# Altium footprint library CPU_STM.PcbLib: 216 footprints (part 15 of 15)
Each footprint in its own frame and in the unit in brackets; x right, y up, seen from the top. Pads: shape width x height; smd on the part's side, far side on the other; paste and mask are expansions set on the pad; w line width, h text height; cw(c..) or ccw(c..) is an arc to the next point about the centre after c.
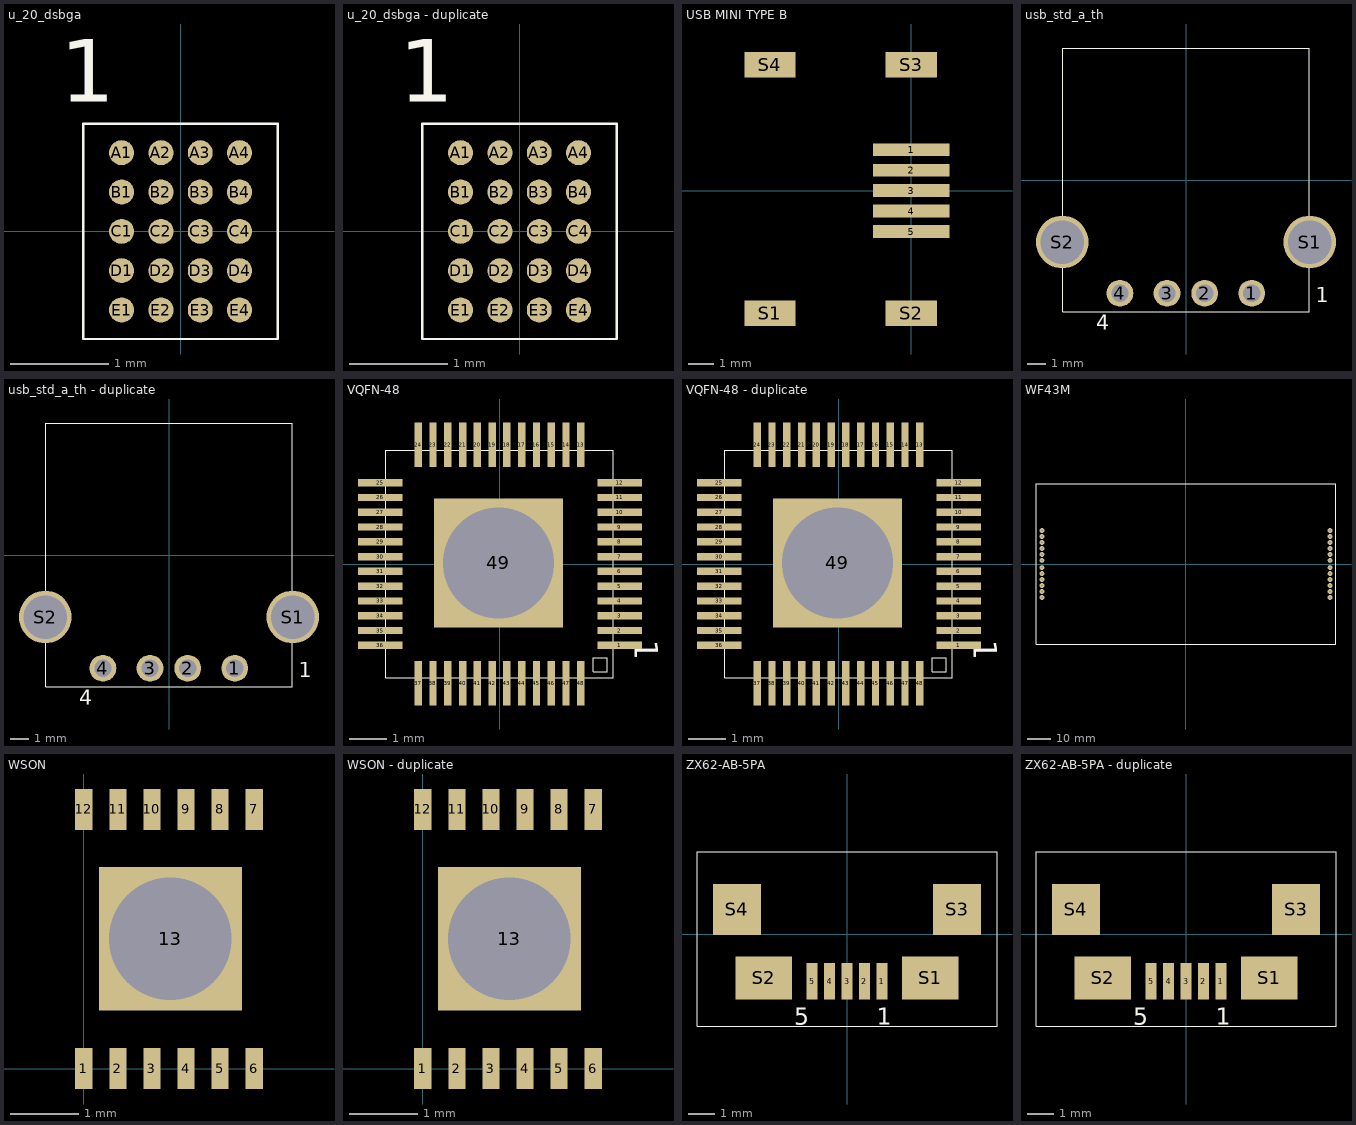
[diagram p14: the footprints below, top view; thin cyan lines are the x and y axes]

## u_20_dsbga [mil] "U_20_DSBGA"
pads (20):
  round 10 smd mask+1.57: A1(-23.62,31.5) A2(-7.87,31.5) A3(7.87,31.5) A4(23.62,31.5) B1(-23.62,15.75) B2(-7.87,15.75) B3(7.87,15.75) B4(23.62,15.75) C1(-23.62,0) C2(-7.87,0) C3(7.87,0) C4(23.62,0) D1(-23.62,-15.75) D2(-7.87,-15.75) D3(7.87,-15.75) D4(23.62,-15.75) E1(-23.62,-31.5) E2(-7.87,-31.5) E3(7.87,-31.5) E4(23.62,-31.5)
Top Overlay:
  lines w1: -38.98,-43.11 38.98,-43.11 38.98,43.11 -38.98,43.11 -38.98,-43.11
  text "1" at -48.28,51.83 h25.2

## u_20_dsbga - duplicate [mil] "U_20_DSBGA"
pads (20):
  round 10 smd mask+1.57: A1(-23.62,31.5) A2(-7.87,31.5) A3(7.87,31.5) A4(23.62,31.5) B1(-23.62,15.75) B2(-7.87,15.75) B3(7.87,15.75) B4(23.62,15.75) C1(-23.62,0) C2(-7.87,0) C3(7.87,0) C4(23.62,0) D1(-23.62,-15.75) D2(-7.87,-15.75) D3(7.87,-15.75) D4(23.62,-15.75) E1(-23.62,-31.5) E2(-7.87,-31.5) E3(7.87,-31.5) E4(23.62,-31.5)
Top Overlay:
  lines w1: -38.98,-43.11 38.98,-43.11 38.98,43.11 -38.98,43.11 -38.98,-43.11
  text "1" at -48.28,51.83 h25.2

## USB MINI TYPE B [mm] "USB MINI TYPE B"
pads (9):
  rect 3x0.5 smd mask+0.06: 1(0,1.6) 2(0,0.8) 3(0,0) 4(0,-0.8) 5(0,-1.6)
  rect 2x1 smd mask+0.06: S1(-5.52,-4.798) S2(0,-4.798) S3(0,4.925) S4(-5.52,4.925)
3D body "usb_a-usb_b-m5-smd-c.stp": height 3.93, standoff -1, extent -8.508,-4.8 0.742,5.1

## usb_std_a_th [mil] "USB_STD_A_TH"
pads (6):
  round 56 hole 36: 1(137.5,-236.5) 2(39.08,-236.5) 3(-39.66,-236.5) 4(-138.09,-236.5)
  round 110 hole 91: S1(258.5,-129.5) S2(-258.5,-129.5)
Top Overlay:
  lines w1: -258,-275.5 -258,275.5 258,275.5 258,-275.5 -258,-275.5
  text "4" at -187.64,-312.71 h31.1
  text "1" at 270.78,-255.34 h31.1

## usb_std_a_th - duplicate [mil] "USB_STD_A_TH"
pads (6):
  round 56 hole 36: 1(137.5,-236.5) 2(39.08,-236.5) 3(-39.66,-236.5) 4(-138.09,-236.5)
  round 110 hole 91: S1(258.5,-129.5) S2(-258.5,-129.5)
Top Overlay:
  lines w1: -258,-275.5 -258,275.5 258,275.5 258,-275.5 -258,-275.5
  text "4" at -187.64,-312.71 h31.1
  text "1" at 270.78,-255.34 h31.1

## VQFN-48 [mm] "U_48_RSL"
pads (49):
  rect 1.2x0.2 smd mask+0.051: 1(3.255,-2.2) 2(3.255,-1.8) 3(3.255,-1.4) 4(3.255,-1) 5(3.255,-0.6) 6(3.255,-0.2) 7(3.255,0.2) 8(3.255,0.6) 9(3.255,1) 10(3.255,1.4) 11(3.255,1.8) 12(3.255,2.2) 25(-3.229,2.2) 26(-3.229,1.8) 27(-3.229,1.4) 28(-3.229,1) 29(-3.229,0.6) 30(-3.229,0.2) 31(-3.229,-0.2) 32(-3.229,-0.6) 33(-3.229,-1) 34(-3.229,-1.4) 35(-3.229,-1.8) 36(-3.229,-2.2)
  rect 0.2x1.2 smd mask+0.051: 13(2.2,3.229) 14(1.8,3.229) 15(1.4,3.229) 16(1,3.229) 17(0.6,3.229) 18(0.2,3.229) 19(-0.2,3.229) 20(-0.6,3.229) 21(-1,3.229) 22(-1.4,3.229) 23(-1.8,3.229) 24(-2.2,3.229) 37(-2.2,-3.229) 38(-1.8,-3.229) 39(-1.4,-3.229) 40(-1,-3.229) 41(-0.6,-3.229) 42(-0.2,-3.229) 43(0.2,-3.229) 44(0.6,-3.229) 45(1,-3.229) 46(1.4,-3.229) 47(1.8,-3.229) 48(2.2,-3.229)
  rect 3.5x3.5 hole 3 square: 49(-0.029,0.029)
Top Overlay:
  lines w0.025: -3.075,-3.075 3.075,-3.075 3.075,3.075 -3.075,3.075 -3.075,-3.075 ; 2.54,-2.921 2.921,-2.921 2.921,-2.54 2.54,-2.54 2.54,-2.921
  text "1" at 3.653,-2.044 h0.64
Top Paste:
  lines w0.025: -1.8,-2.25 -0.65,-2.25 -0.65,-1.1 -1.8,-1.1 -1.8,-2.25 ; -1.8,-0.8 -0.65,-0.8 -0.65,0.35 -1.8,0.35 -1.8,-0.8 ; -1.8,0.65 -0.65,0.65 -0.65,1.8 -1.8,1.8 -1.8,0.65 ; -0.35,-2.25 0.8,-2.25 0.8,-1.1 -0.35,-1.1 -0.35,-2.25 ; -0.35,-0.8 0.8,-0.8 0.8,0.35 -0.35,0.35 -0.35,-0.8 ; -0.35,0.65 0.8,0.65 0.8,1.8 -0.35,1.8 -0.35,0.65 ; 1.1,-2.25 2.25,-2.25 2.25,-1.1 1.1,-1.1 1.1,-2.25 ; 1.1,-0.8 2.25,-0.8 2.25,0.35 1.1,0.35 1.1,-0.8 ; 1.1,0.65 2.25,0.65 2.25,1.8 1.1,1.8 1.1,0.65

## VQFN-48 - duplicate [mm] "U_48_RSL"
pads (49):
  rect 1.2x0.2 smd mask+0.051: 1(3.255,-2.2) 2(3.255,-1.8) 3(3.255,-1.4) 4(3.255,-1) 5(3.255,-0.6) 6(3.255,-0.2) 7(3.255,0.2) 8(3.255,0.6) 9(3.255,1) 10(3.255,1.4) 11(3.255,1.8) 12(3.255,2.2) 25(-3.229,2.2) 26(-3.229,1.8) 27(-3.229,1.4) 28(-3.229,1) 29(-3.229,0.6) 30(-3.229,0.2) 31(-3.229,-0.2) 32(-3.229,-0.6) 33(-3.229,-1) 34(-3.229,-1.4) 35(-3.229,-1.8) 36(-3.229,-2.2)
  rect 0.2x1.2 smd mask+0.051: 13(2.2,3.229) 14(1.8,3.229) 15(1.4,3.229) 16(1,3.229) 17(0.6,3.229) 18(0.2,3.229) 19(-0.2,3.229) 20(-0.6,3.229) 21(-1,3.229) 22(-1.4,3.229) 23(-1.8,3.229) 24(-2.2,3.229) 37(-2.2,-3.229) 38(-1.8,-3.229) 39(-1.4,-3.229) 40(-1,-3.229) 41(-0.6,-3.229) 42(-0.2,-3.229) 43(0.2,-3.229) 44(0.6,-3.229) 45(1,-3.229) 46(1.4,-3.229) 47(1.8,-3.229) 48(2.2,-3.229)
  rect 3.5x3.5 hole 3 square: 49(-0.029,0.029)
Top Overlay:
  lines w0.025: -3.075,-3.075 3.075,-3.075 3.075,3.075 -3.075,3.075 -3.075,-3.075 ; 2.54,-2.921 2.921,-2.921 2.921,-2.54 2.54,-2.54 2.54,-2.921
  text "1" at 3.653,-2.044 h0.64
Top Paste:
  lines w0.025: -1.8,-2.25 -0.65,-2.25 -0.65,-1.1 -1.8,-1.1 -1.8,-2.25 ; -1.8,-0.8 -0.65,-0.8 -0.65,0.35 -1.8,0.35 -1.8,-0.8 ; -1.8,0.65 -0.65,0.65 -0.65,1.8 -1.8,1.8 -1.8,0.65 ; -0.35,-2.25 0.8,-2.25 0.8,-1.1 -0.35,-1.1 -0.35,-2.25 ; -0.35,-0.8 0.8,-0.8 0.8,0.35 -0.35,0.35 -0.35,-0.8 ; -0.35,0.65 0.8,0.65 0.8,1.8 -0.35,1.8 -0.35,0.65 ; 1.1,-2.25 2.25,-2.25 2.25,-1.1 1.1,-1.1 1.1,-2.25 ; 1.1,-0.8 2.25,-0.8 2.25,0.35 1.1,0.35 1.1,-0.8 ; 1.1,0.65 2.25,0.65 2.25,1.8 1.1,1.8 1.1,0.65

## WF43M [mm]
pads (24):
  round 2 hole 0.762: 1(-60.25,-14) 2(-60.25,-11.5) 3(-60.25,-9) 4(-60.25,-6.5) 5(-60.25,-4) 6(-60.25,-1.5) 7(-60.25,1.5) 8(-60.25,4) 9(-60.25,6.5) 10(-60.25,9) 11(-60.25,14) 12(-60.25,11.5) 13(60.25,-14) 14(60.25,-11.5) 15(60.25,-9) 16(60.25,-6.5) 17(60.25,-4) 18(60.25,-1.5) 19(60.25,1.5) 20(60.25,4) 21(60.25,6.5) 22(60.25,9) 23(60.25,11.5) 24(60.25,14)
Top Overlay:
  lines w0.2: -27.75,-33.6 -36.5,-33.6 -54,-33.6 -62.75,-33.6 ; -62.75,-33.6 -62.75,33.6 62.75,33.6 62.75,-33.6 -62.75,-33.6

## WSON [mm] "U_48_RSL"
pads (13):
  rect 0.25x0.6 smd mask+0.2: 1(0,0) 2(0.5,0) 3(1,0) 4(1.5,0) 5(2,0) 6(2.5,0) 7(2.5,3.8) 8(2,3.8) 9(1.5,3.8) 10(1,3.8) 11(0.5,3.8) 12(0,3.8)
  rect 2.1x2.1 hole 1.8 square mask+0.2: 13(1.27,1.905)

## WSON - duplicate [mm] "U_48_RSL"
pads (13):
  rect 0.25x0.6 smd mask+0.2: 1(0,0) 2(0.5,0) 3(1,0) 4(1.5,0) 5(2,0) 6(2.5,0) 7(2.5,3.8) 8(2,3.8) 9(1.5,3.8) 10(1,3.8) 11(0.5,3.8) 12(0,3.8)
  rect 2.1x2.1 hole 1.8 square mask+0.2: 13(1.27,1.905)

## ZX62-AB-5PA [mm] "ZX62-AB-5PA"
pads (9):
  rect 0.4x1.35 smd: 1(1.3,-1.75) 2(0.65,-1.75) 3(0,-1.75) 4(-0.65,-1.75) 5(-1.3,-1.75)
  rect 2.1x1.6 smd: S1(3.1,-1.625) S2(-3.1,-1.625)
  rect 1.8x1.9 smd: S3(4.1,0.925) S4(-4.1,0.925)
Top Overlay:
  lines w0.025: -5.588,-3.429 -5.588,3.075 5.588,3.075 5.588,-3.429 -5.588,-3.429
  text "1" at 1.105,-3.362 h0.64
  text "5" at -1.971,-3.362 h0.64

## ZX62-AB-5PA - duplicate [mm] "ZX62-AB-5PA"
pads (9):
  rect 0.4x1.35 smd: 1(1.3,-1.75) 2(0.65,-1.75) 3(0,-1.75) 4(-0.65,-1.75) 5(-1.3,-1.75)
  rect 2.1x1.6 smd: S1(3.1,-1.625) S2(-3.1,-1.625)
  rect 1.8x1.9 smd: S3(4.1,0.925) S4(-4.1,0.925)
Top Overlay:
  lines w0.025: -5.588,-3.429 -5.588,3.075 5.588,3.075 5.588,-3.429 -5.588,-3.429
  text "1" at 1.105,-3.362 h0.64
  text "5" at -1.971,-3.362 h0.64